# Altium footprint library Footprints.PcbLib: 266 footprints (part 16 of 17)
Each footprint in its own frame and in the unit in brackets; x right, y up, seen from the top. Pads: shape width x height; smd on the part's side, far side on the other; paste and mask are expansions set on the pad; w line width, h text height; cw(c..) or ccw(c..) is an arc to the next point about the centre after c.
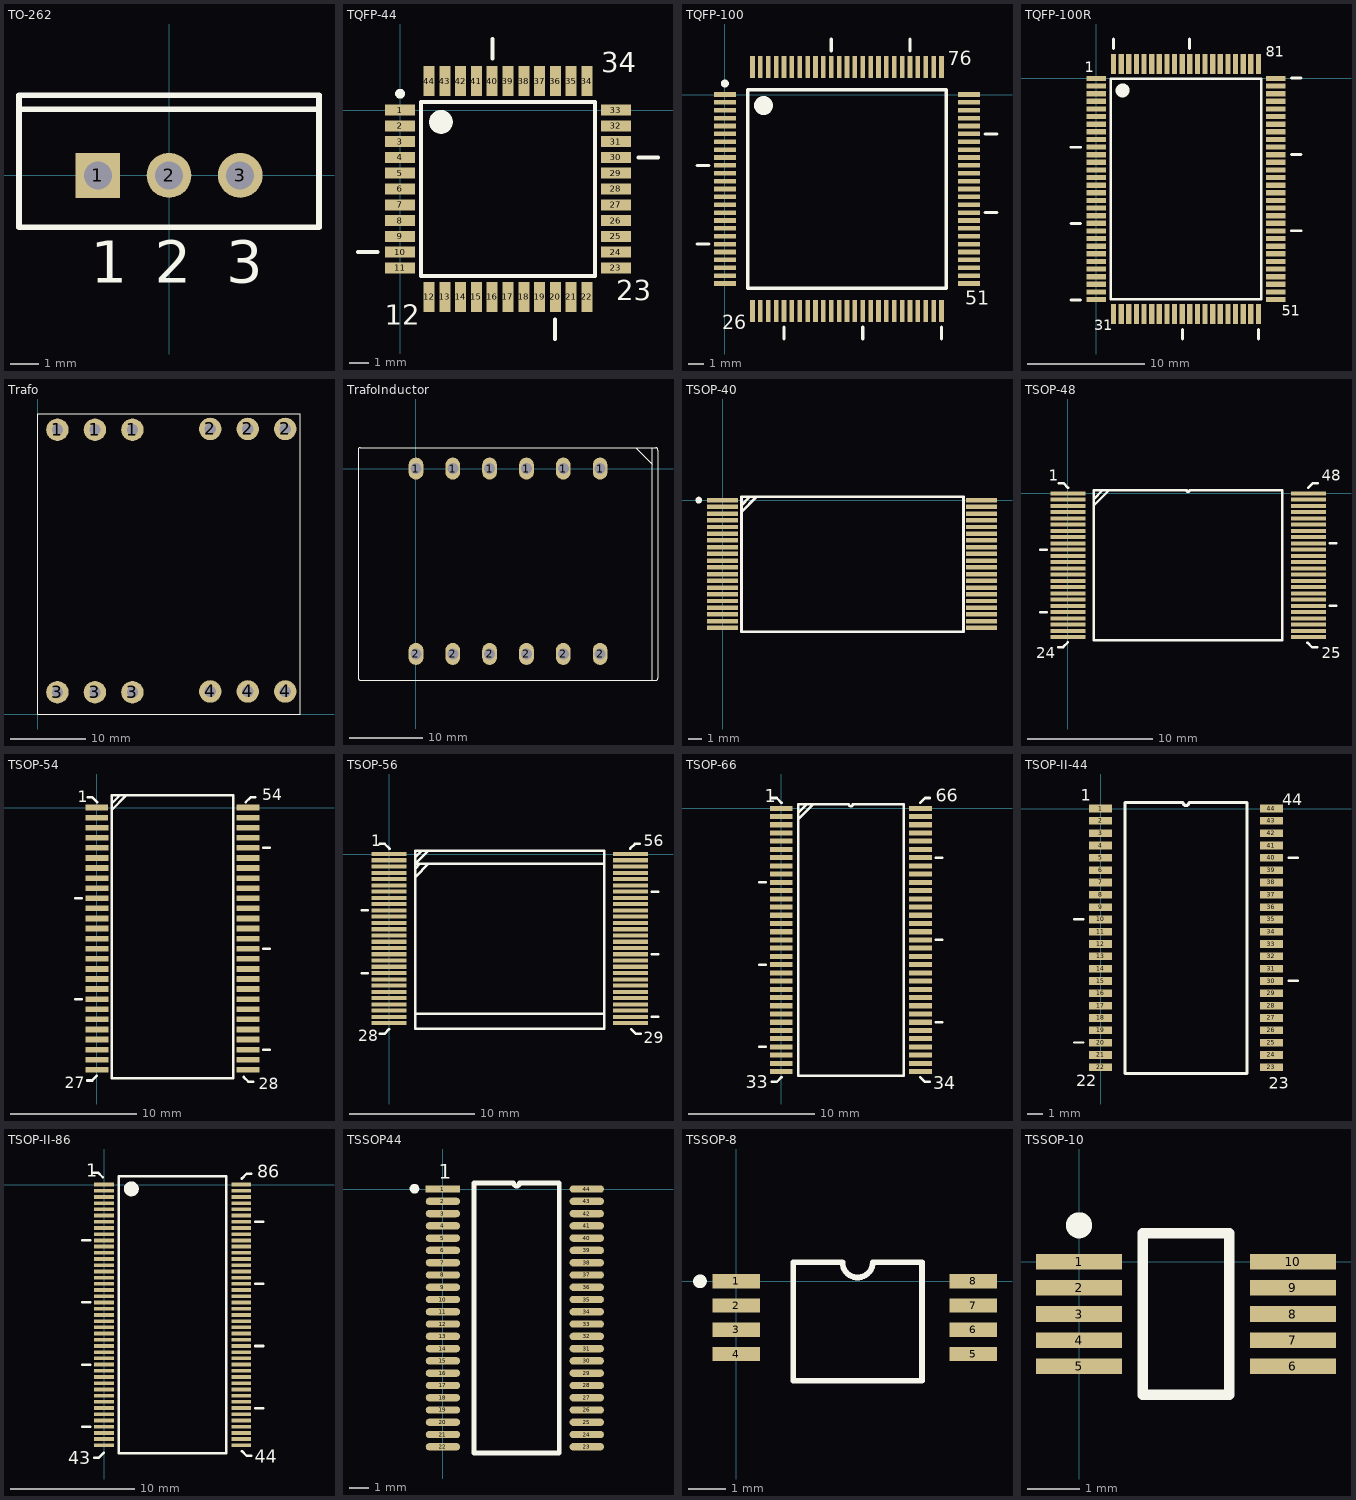
[diagram p15: the footprints below, top view; thin cyan lines are the x and y axes]

## TO-262 [mm] "TO, Thru-Hole, Vertical, Heatsink Mounted; 3 In-Line Leads; Pitch 2.54 mm"
height 14.6
pads (3):
  rect 1.6x1.6 hole 1: 1(-2.54,0)
  round 1.6 hole 1: 2(0,0) 3(2.54,0)
Top Overlay:
  lines w0.2: -5.35,2.35 5.35,2.35 ; -5.35,-1.85 -5.35,2.85 5.35,2.85 5.35,-1.85 -5.35,-1.85
  text "3" at 2.04,-3.825 h1.5
  text "1" at -2.79,-3.825 h1.5
  text "2" at -0.5,-3.825 h1.5

## TQFP-44 [mm] "TQFP, 44-Leads, Body 12,2x12,2mm (max), Pitch 0,80mm, IPC Medium Density"
height 1.2
pads (44):
  rect 1.52x0.56 smd: 1(0,0) 2(0,-0.8) 3(0,-1.6) 4(0,-2.4) 5(0,-3.2) 6(0,-4) 7(0,-4.8) 8(0,-5.6) 9(0,-6.4) 10(0,-7.2) 11(0,-8) 23(10.94,-8) 24(10.94,-7.2) 25(10.94,-6.4) 26(10.94,-5.6) 27(10.94,-4.8) 28(10.94,-4) 29(10.94,-3.2) 30(10.94,-2.4) 31(10.94,-1.6) 32(10.94,-0.8) 33(10.94,0)
  rect 0.56x1.52 smd: 12(1.47,-9.47) 13(2.27,-9.47) 14(3.07,-9.47) 15(3.87,-9.47) 16(4.67,-9.47) 17(5.47,-9.47) 18(6.27,-9.47) 19(7.07,-9.47) 20(7.87,-9.47) 21(8.67,-9.47) 22(9.47,-9.47) 34(9.47,1.47) 35(8.67,1.47) 36(7.87,1.47) 37(7.07,1.47) 38(6.27,1.47) 39(5.47,1.47) 40(4.67,1.47) 41(3.87,1.47) 42(3.07,1.47) 43(2.27,1.47) 44(1.47,1.47)
Top Overlay:
  circle w0.6: c2.07,-0.6 r0.3
  circle w0.25: c0,0.83 r0.125
  lines w0.2: 1.07,-8.4 9.87,-8.4 9.87,0.4 1.07,0.4 1.07,-8.4
  lines w0.203: -2.134,-7.188 -1.143,-7.188 ; 4.682,2.613 4.682,3.604 ; 7.858,-11.604 7.858,-10.613 ; 12.083,-2.412 13.074,-2.412
  text "34" at 10.185,1.93 h1.02
  text "23" at 10.947,-9.652 h1.02
  text "12" at -0.787,-10.871 h1.02
3D body "User Library-TQFP-44-1.STEP": height 1.1, standoff 0, extent -0.533,-9.988 11.467,2.012

## TQFP-100 [mm] "TQFP, 100-Leads, Body 16mm x 16mm x 1.6mm, Pitch 0,50mm"
height 1.6
pads (100):
  rect 1.4x0.3 smd: 1(0,0) 2(0,-0.5) 3(0,-1) 4(0,-1.5) 5(0,-2) 6(0,-2.5) 7(0,-3) 8(0,-3.5) 9(0,-4) 10(0,-4.5) 11(0,-5) 12(0,-5.5) 13(0,-6) 14(0,-6.5) 15(0,-7) 16(0,-7.5) 17(0,-8) 18(0,-8.5) 19(0,-9) 20(0,-9.5) 21(0,-10) 22(0,-10.5) 23(0,-11) 24(0,-11.5) 25(0,-12) 51(15.5,-12) 52(15.5,-11.5) 53(15.5,-11) 54(15.5,-10.5) 55(15.5,-10) 56(15.5,-9.5) 57(15.5,-9) 58(15.5,-8.5) 59(15.5,-8) 60(15.5,-7.5) 61(15.5,-7) 62(15.5,-6.5) 63(15.5,-6) 64(15.5,-5.5) 65(15.5,-5) 66(15.5,-4.5) 67(15.5,-4) 68(15.5,-3.5) 69(15.5,-3) 70(15.5,-2.5) 71(15.5,-2) 72(15.5,-1.5) 73(15.5,-1) 74(15.5,-0.5) 75(15.5,0)
  rect 0.3x1.4 smd: 26(1.75,-13.75) 27(2.25,-13.75) 28(2.75,-13.75) 29(3.25,-13.75) 30(3.75,-13.75) 31(4.25,-13.75) 32(4.75,-13.75) 33(5.25,-13.75) 34(5.75,-13.75) 35(6.25,-13.75) 36(6.75,-13.75) 37(7.25,-13.75) 38(7.75,-13.75) 39(8.25,-13.75) 40(8.75,-13.75) 41(9.25,-13.75) 42(9.75,-13.75) 43(10.25,-13.75) 44(10.75,-13.75) 45(11.25,-13.75) 46(11.75,-13.75) 47(12.25,-13.75) 48(12.75,-13.75) 49(13.25,-13.75) 50(13.75,-13.75) 76(13.75,1.75) 77(13.25,1.75) 78(12.75,1.75) 79(12.25,1.75) 80(11.75,1.75) 81(11.25,1.75) 82(10.75,1.75) 83(10.25,1.75) 84(9.75,1.75) 85(9.25,1.75) 86(8.75,1.75) 87(8.25,1.75) 88(7.75,1.75) 89(7.25,1.75) 90(6.75,1.75) 91(6.25,1.75) 92(5.75,1.75) 93(5.25,1.75) 94(4.75,1.75) 95(4.25,1.75) 96(3.75,1.75) 97(3.25,1.75) 98(2.75,1.75) 99(2.25,1.75) 100(1.75,1.75)
Top Overlay:
  circle w0.25: c0,0.7 r0.125
  circle w0.6: c2.45,-0.7 r0.3
  lines w0.2: 1.45,-12.3 1.45,0.3 14.05,0.3 14.05,-12.3 1.45,-12.3
  lines w0.203: -1.775,-9.501 -1.013,-9.501 ; -1.775,-4.501 -1.013,-4.501 ; 3.751,-15.525 3.751,-14.763 ; 6.749,2.763 6.749,3.525 ; 8.751,-15.525 8.751,-14.763 ; 11.749,2.763 11.749,3.525 ; 13.751,-15.525 13.751,-14.763 ; 16.513,-7.499 17.275,-7.499 ; 16.513,-2.499 17.275,-2.499
  text "26" at -0.175,-14.915 h0.89
  text "51" at 15.268,-13.341 h0.89
  text "76" at 14.151,1.849 h0.89
3D body "SW3dPS-TQFP100-1.STEP": height 1.61, standoff -0.01, extent -0.251,-13.999 15.749,2.001

## TQFP-100R [mm] "TQFP, 100-Leads, Body 22mm x 16mm x 1.6mm, Pitch 0,65mm"
height 1.6
pads (100):
  rect 1.7x0.45 smd: 1(0,0) 2(0,-0.65) 3(0,-1.3) 4(0,-1.95) 5(0,-2.6) 6(0,-3.25) 7(0,-3.9) 8(0,-4.55) 9(0,-5.2) 10(0,-5.85) 11(0,-6.5) 12(0,-7.15) 13(0,-7.8) 14(0,-8.45) 15(0,-9.1) 16(0,-9.75) 17(0,-10.4) 18(0,-11.05) 19(0,-11.7) 20(0,-12.35) 21(0,-13) 22(0,-13.65) 23(0,-14.3) 24(0,-14.95) 25(0,-15.6) 26(0,-16.25) 27(0,-16.9) 28(0,-17.55) 29(0,-18.2) 30(0,-18.85) 51(15.3,-18.85) 52(15.3,-18.2) 53(15.3,-17.55) 54(15.3,-16.9) 55(15.3,-16.25) 56(15.3,-15.6) 57(15.3,-14.95) 58(15.3,-14.3) 59(15.3,-13.65) 60(15.3,-13) 61(15.3,-12.35) 62(15.3,-11.7) 63(15.3,-11.05) 64(15.3,-10.4) 65(15.3,-9.75) 66(15.3,-9.1) 67(15.3,-8.45) 68(15.3,-7.8) 69(15.3,-7.15) 70(15.3,-6.5) 71(15.3,-5.85) 72(15.3,-5.2) 73(15.3,-4.55) 74(15.3,-3.9) 75(15.3,-3.25) 76(15.3,-2.6) 77(15.3,-1.95) 78(15.3,-1.3) 79(15.3,-0.65) 80(15.3,0)
  rect 0.45x1.7 smd: 31(1.475,-20.075) 32(2.125,-20.075) 33(2.775,-20.075) 34(3.425,-20.075) 35(4.075,-20.075) 36(4.725,-20.075) 37(5.375,-20.075) 38(6.025,-20.075) 39(6.675,-20.075) 40(7.325,-20.075) 41(7.975,-20.075) 42(8.625,-20.075) 43(9.275,-20.075) 44(9.925,-20.075) 45(10.575,-20.075) 46(11.225,-20.075) 47(11.875,-20.075) 48(12.525,-20.075) 49(13.175,-20.075) 50(13.825,-20.075) 81(13.825,1.225) 82(13.175,1.225) 83(12.525,1.225) 84(11.875,1.225) 85(11.225,1.225) 86(10.575,1.225) 87(9.925,1.225) 88(9.275,1.225) 89(8.625,1.225) 90(7.975,1.225) 91(7.325,1.225) 92(6.675,1.225) 93(6.025,1.225) 94(5.375,1.225) 95(4.725,1.225) 96(4.075,1.225) 97(3.425,1.225) 98(2.775,1.225) 99(2.125,1.225) 100(1.475,1.225)
Top Overlay:
  circle w0.6: c2.25,-1.025 r0.3
  lines w0.2: 1.25,-18.825 1.25,-0.025 14.05,-0.025 14.05,-18.825 1.25,-18.825
  lines w0.254: -2.134,-18.867 -1.321,-18.867 ; -2.134,-12.367 -1.321,-12.367 ; -2.134,-5.867 -1.321,-5.867 ; 1.458,2.546 1.458,3.359 ; 7.342,-22.209 7.342,-21.396 ; 7.958,2.546 7.958,3.359 ; 13.842,-22.209 13.842,-21.396 ; 16.621,-12.983 17.434,-12.983 ; 16.621,-6.483 17.434,-6.483 ; 16.621,0.017 17.434,0.017
  text "1" at -0.991,0.508 h0.89
  text "81" at 14.453,1.829 h0.89
  text "51" at 15.799,-20.244 h0.89
  text "31" at -0.178,-21.463 h0.89
3D body "tqfp-100-1.6mm.stp": height 1.55, standoff -0.1, extent -0.254,-20.327 15.546,1.473

## Trafo [mm]
pads (12):
  round 3 hole 1.5: 1(2.626,37.898) 1(7.626,37.898) 1(12.626,37.898) 2(23,38) 2(28,38) 2(33,38) 3(2.626,2.898) 3(7.626,2.898) 3(12.626,2.898) 4(23,3) 4(28,3) 4(33,3)
Top Overlay:
  lines w0.152: 0,0 35,0 35,40 0,40 0,0
3D body: height 35, standoff 30, extent -0.089,6.985 34.989,34.785
3D body: height 30, standoff 10, extent -0.17,7.163 4.296,34.786
3D body: height 30, standoff 10, extent 4.298,7.803 30.196,33.752
3D body: height 10, standoff 1, extent -0.146,0 35,39.768
3D body: height 30, standoff 10, extent 30.452,7.084 34.918,34.708

## TrafoInductor [mm]
pads (12):
  oval 2x3 hole 1.5: 1(0,0) 1(5,0) 1(10,0) 1(15,0) 1(20,0) 1(25,0) 2(0,-25.146) 2(5,-25.146) 2(10,-25.146) 2(15,-25.146) 2(20,-25.146) 2(25,-25.146)
Top Overlay:
  lines w0.152: -7.865,2.515 cw(c-7.544,2.515) -7.544,2.836 ; -7.855,2.515 -7.849,-28.397 ; -7.844,-28.397 ccw(c-7.522,-28.397) -7.522,-28.719 ; -7.544,2.841 32.53,2.841 ; -7.522,-28.731 32.534,-28.731 ; 29.82,2.819 32.055,0.584 32.055,0.559 ; 32.055,-28.702 32.055,2.841 ; 32.53,2.836 cw(c32.53,2.515) 32.851,2.515 ; 32.534,-28.726 ccw(c32.534,-28.405) 32.856,-28.405 32.856,2.515
3D body: height 10, standoff 1, extent -7.772,-28.804 32.131,2.87
3D body: height 30, standoff 10, extent -3.198,-28.077 26.684,1.864
3D body: height 30, standoff 10, extent -7.607,-28.969 -3.137,2.603
3D body: height 30, standoff 10, extent 27.546,-28.943 32.017,2.629
3D body: height 35, standoff 30, extent -7.556,-29.07 32.347,2.604

## TSOP-40 [mil]
pads (40):
  rect 90x13 smd: 1(0,0) 2(0,-19.68) 3(0,-39.37) 4(0,-59.05) 5(0,-78.74) 6(0,-98.42) 7(0,-118.11) 8(0,-137.79) 9(0,-157.48) 10(0,-177.16) 11(0,-196.85) 12(0,-216.53) 13(0,-236.22) 14(0,-255.91) 15(0,-275.59) 16(0,-295.27) 17(0,-314.96) 18(0,-334.64) 19(0,-354.33) 20(0,-374.01) 21(757.87,-374.01) 22(757.87,-354.33) 23(757.87,-334.64) 24(757.87,-314.96) 25(757.87,-295.27) 26(757.87,-275.59) 27(757.87,-255.91) 28(757.87,-236.22) 29(757.87,-216.53) 30(757.87,-196.85) 31(757.87,-177.16) 32(757.87,-157.48) 33(757.87,-137.79) 34(757.87,-118.11) 35(757.87,-98.42) 36(757.87,-78.74) 37(757.87,-59.05) 38(757.87,-39.37) 39(757.87,-19.68) 40(757.87,0)
Top Overlay:
  circle w9.84: c-70,0 r4.92
  lines w8: 55,-35 100,10 ; 55,-15 80,10 ; 55,-385 705,-385 705,10 55,10 55,-385

## TSOP-48 [mm]
pads (48):
  rect 2.8x0.33 smd: 1(0,0) 2(0,-0.5) 3(0,-1) 4(0,-1.5) 5(0,-2) 6(0,-2.5) 7(0,-3) 8(0,-3.5) 9(0,-4) 10(0,-4.5) 11(0,-5) 12(0,-5.5) 13(0,-6) 14(0,-6.5) 15(0,-7) 16(0,-7.5) 17(0,-8) 18(0,-8.5) 19(0,-9) 20(0,-9.5) 21(0,-10) 22(0,-10.5) 23(0,-11) 24(0,-11.5) 25(19.25,-11.5) 26(19.25,-11) 27(19.25,-10.5) 28(19.25,-10) 29(19.25,-9.5) 30(19.25,-9) 31(19.25,-8.5) 32(19.25,-8) 33(19.25,-7.5) 34(19.25,-7) 35(19.25,-6.5) 36(19.25,-6) 37(19.25,-5.5) 38(19.25,-5) 39(19.25,-4.5) 40(19.25,-4) 41(19.25,-3.5) 42(19.25,-3) 43(19.25,-2.5) 44(19.25,-2) 45(19.25,-1.5) 46(19.25,-1) 47(19.25,-0.5) 48(19.25,0)
Top Overlay:
  lines w0.2: 2.085,-0.955 3.29,0.25 ; 2.085,-0.447 2.782,0.25
  lines w0.203: -2.204,-9.5 -1.696,-9.5 ; -2.204,-4.5 -1.696,-4.5 ; -0.762,-12.295 -0.381,-12.295 0,-11.914 ; -0.737,0.813 -0.356,0.813 0.025,0.432 ; 19.174,-11.939 19.555,-12.32 19.936,-12.32 ; 19.225,0.432 19.606,0.813 19.987,0.813 ; 20.946,-9 21.454,-9 ; 20.946,-4 21.454,-4 ; 2.085,-11.75 17.165,-11.75 17.165,0.25 9.75,0.25 cw(c9.625,0.25) 9.5,0.25 2.085,0.25 2.085,-11.75
  text "24" at -2.54,-13.208 h0.89
  text "1" at -1.524,1.016 h0.89
  text "25" at 20.32,-13.208 h0.89
  text "48" at 20.32,1.016 h0.89
3D body "TSOP-48.STEP": height 1.2, standoff -0.06, extent -0.425,-11.8 19.675,0.3

## TSOP-54 [mm]
pads (54):
  rect 1.8x0.45 smd: 1(0.01,0) 2(0.01,-0.8) 3(0.02,-1.6) 4(0.02,-2.4) 5(0.02,-3.2) 6(0.02,-4) 7(0.02,-4.8) 8(0.02,-5.6) 9(0.02,-6.4) 10(0.02,-7.2) 11(0.02,-8) 12(0.02,-8.8) 13(0.02,-9.6) 14(0.02,-10.4) 15(0.02,-11.2) 16(0.02,-12) 17(0.02,-12.8) 18(0.02,-13.6) 19(0.02,-14.4) 20(0.02,-15.2) 21(0.02,-16) 22(0.02,-16.8) 23(0.02,-17.6) 24(0.02,-18.4) 25(0.02,-19.2) 26(0.02,-20) 27(0.02,-20.8) 28(12.01,-20.8) 29(12.01,-20) 30(12.01,-19.2) 31(12.01,-18.4) 32(12.01,-17.6) 33(12.01,-16.8) 34(12.01,-16) 35(12.01,-15.2) 36(12.01,-14.4) 37(12.01,-13.6) 38(12.01,-12.8) 39(12.01,-12) 40(12.01,-11.2) 41(12.01,-10.4) 42(12.01,-9.6) 43(12.01,-8.8) 44(12.01,-8) 45(12.01,-7.2) 46(12.01,-6.4) 47(12.01,-5.6) 48(12.01,-4.8) 49(12.01,-4) 50(12.01,-3.2) 51(12.01,-2.4) 52(12.01,-1.6) 53(12.01,-0.8) 54(12.01,0)
Top Overlay:
  lines w0.203: -1.702,-15.2 -1.194,-15.2 ; -1.702,-7.2 -1.194,-7.2 ; -0.747,-21.65 -0.366,-21.65 0.015,-21.269 ; -0.727,0.813 -0.346,0.813 0.035,0.432 ; 1.194,-0.178 2.337,0.965 ; 1.194,0.33 1.829,0.965 ; 11.655,-21.369 12.036,-21.75 12.417,-21.75 ; 11.825,0.432 12.206,0.813 12.587,0.813 ; 13.224,-19.2 13.732,-19.2 ; 13.224,-11.2 13.732,-11.2 ; 13.224,-3.2 13.732,-3.2 ; 1.194,-21.488 10.846,-21.488 10.846,0.965 1.194,0.965 1.194,-21.488
  text "27" at -2.54,-22.276 h0.89
  text "1" at -1.489,0.432 h0.89
  text "28" at 12.852,-22.327 h0.89
  text "54" at 13.123,0.584 h0.89

## TSOP-56 [mm]
pads (56):
  rect 2.8x0.33 smd: 1(0,0) 2(0,-0.5) 3(0,-1) 4(0,-1.5) 5(0,-2) 6(0,-2.5) 7(0,-3) 8(0,-3.5) 9(0,-4) 10(0,-4.5) 11(0,-5) 12(0,-5.5) 13(0,-6) 14(0,-6.5) 15(0,-7) 16(0,-7.5) 17(0,-8) 18(0,-8.5) 19(0,-9) 20(0,-9.5) 21(0,-10) 22(0,-10.5) 23(0,-11) 24(0,-11.5) 25(0,-12) 26(0,-12.5) 27(0,-13) 28(0,-13.5) 29(19.25,-13.5) 30(19.25,-13) 31(19.25,-12.5) 32(19.25,-12) 33(19.25,-11.5) 34(19.25,-11) 35(19.25,-10.5) 36(19.25,-10) 37(19.25,-9.5) 38(19.25,-9) 39(19.25,-8.5) 40(19.25,-8) 41(19.25,-7.5) 42(19.25,-7) 43(19.25,-6.5) 44(19.25,-6) 45(19.25,-5.5) 46(19.25,-5) 47(19.25,-4.5) 48(19.25,-4) 49(19.25,-3.5) 50(19.25,-3) 51(19.25,-2.5) 52(19.25,-2) 53(19.25,-1.5) 54(19.25,-1) 55(19.25,-0.5) 56(19.25,0)
Top Overlay:
  lines w0.203: -2.204,-9.5 -1.696,-9.5 ; -2.204,-4.5 -1.696,-4.5 ; -0.762,-14.351 -0.381,-14.351 0,-13.97 ; -0.737,0.813 -0.356,0.813 0.025,0.432 ; 2.085,-1.829 3.142,-0.772 ; 2.085,-1.168 2.481,-0.772 ; 2.085,-0.254 2.593,0.254 ; 2.093,-12.741 17.104,-12.741 ; 3.101,0.254 2.085,-0.762 17.146,-0.762 ; 17.145,0.254 2.085,0.25 2.085,-11.75 2.083,-13.945 17.17,-13.945 17.165,-11.75 17.165,0.25 ; 19.225,0.432 19.606,0.813 19.987,0.813 ; 19.304,-13.97 19.685,-14.351 20.066,-14.351 ; 20.946,-13 21.454,-13 ; 20.946,-8 21.454,-8 ; 20.946,-3 21.454,-3
  text "56" at 20.32,0.635 h0.89
  text "29" at 20.32,-15.088 h0.89
  text "1" at -1.422,0.635 h0.89
  text "28" at -2.489,-14.961 h0.89
3D body "TSOP-48.STEP": height 1.2, standoff -0.06, extent -0.65,-12.8 19.45,-0.7

## TSOP-66 [mm]
pads (66):
  rect 1.8x0.4 smd: 1(0,0) 2(0,-0.65) 3(0,-1.3) 4(0,-1.95) 5(0,-2.6) 6(0,-3.25) 7(0,-3.9) 8(0,-4.55) 9(0,-5.2) 10(0,-5.85) 11(0,-6.5) 12(0,-7.15) 13(0,-7.8) 14(0,-8.45) 15(0,-9.1) 16(0,-9.75) 17(0,-10.4) 18(0,-11.05) 19(0,-11.7) 20(0,-12.35) 21(0,-13) 22(0,-13.65) 23(0,-14.3) 24(0,-14.95) 25(0,-15.6) 26(0,-16.25) 27(0,-16.9) 28(0,-17.55) 29(0,-18.2) 30(0,-18.85) 31(0,-19.5) 32(0,-20.15) 33(0,-20.8) 34(11,-20.8) 35(11,-20.15) 36(11,-19.5) 37(11,-18.85) 38(11,-18.2) 39(11,-17.55) 40(11,-16.9) 41(11,-16.25) 42(11,-15.6) 43(11,-14.95) 44(11,-14.3) 45(11,-13.65) 46(11,-13) 47(11,-12.35) 48(11,-11.7) 49(11,-11.05) 50(11,-10.4) 51(11,-9.75) 52(11,-9.1) 53(11,-8.45) 54(11,-7.8) 55(11,-7.15) 56(11,-6.5) 57(11,-5.85) 58(11,-5.2) 59(11,-4.55) 60(11,-3.9) 61(11,-3.25) 62(11,-2.6) 63(11,-1.95) 64(11,-1.3) 65(11,-0.65) 66(11,0)
Top Overlay:
  lines w0.2: 1.335,-0.88 2.54,0.325 ; 1.335,-0.372 2.032,0.325 ; 1.335,-21.125 9.665,-21.125 9.665,0.325 5.662,0.325 cw(c5.5,0.325) 5.337,0.325 1.335,0.325 1.335,-21.125
  lines w0.203: -1.722,-18.85 -1.214,-18.85 ; -1.722,-12.35 -1.214,-12.35 ; -1.722,-5.85 -1.214,-5.85 ; -0.737,-21.613 -0.356,-21.613 0.025,-21.232 ; -0.737,0.813 -0.356,0.813 0.025,0.432 ; 10.975,-21.232 11.356,-21.613 11.737,-21.613 ; 10.975,0.432 11.356,0.813 11.737,0.813 ; 12.214,-16.9 12.722,-16.9 ; 12.214,-10.4 12.722,-10.4 ; 12.214,-3.9 12.722,-3.9
  text "66" at 12.192,0.508 h1.02
  text "34" at 12.014,-22.174 h1.02
  text "1" at -1.295,0.483 h1.02
  text "33" at -2.819,-22.123 h1.02
3D body "TSOP-66.STEP": height 1.2, standoff 0, extent -0.355,-21.545 11.405,0.675

## TSOP-II-44 [mm]
pads (44):
  rect 1.5x0.5 smd: 1(0,0) 2(0,-0.8) 3(0,-1.6) 4(0,-2.4) 5(0,-3.2) 6(0,-4) 7(0,-4.8) 8(0,-5.6) 9(0,-6.4) 10(0,-7.2) 11(0,-8) 12(0,-8.8) 13(0,-9.6) 14(0,-10.4) 15(0,-11.2) 16(0,-12) 17(0,-12.8) 18(0,-13.6) 19(0,-14.4) 20(0,-15.2) 21(0,-16) 22(0,-16.8) 23(11.1,-16.8) 24(11.1,-16) 25(11.1,-15.2) 26(11.1,-14.4) 27(11.1,-13.6) 28(11.1,-12.8) 29(11.1,-12) 30(11.1,-11.2) 31(11.1,-10.4) 32(11.1,-9.6) 33(11.1,-8.8) 34(11.1,-8) 35(11.1,-7.2) 36(11.1,-6.4) 37(11.1,-5.6) 38(11.1,-4.8) 39(11.1,-4) 40(11.1,-3.2) 41(11.1,-2.4) 42(11.1,-1.6) 43(11.1,-0.8) 44(11.1,0)
Top Overlay:
  lines w0.152: -1.727,-15.188 -1.118,-15.188 ; -1.727,-7.188 -1.118,-7.188 ; 12.218,-11.188 12.827,-11.188 ; 12.218,-3.188 12.827,-3.188
  lines w0.2: 1.585,-17.2 9.515,-17.2 9.515,0.4 5.75,0.4 cw(c5.55,0.4) 5.35,0.4 1.585,0.4 1.585,-17.2
  text "1" at -1.27,0.508 h0.76
  text "22" at -1.575,-18.034 h0.76
  text "44" at 11.786,0.229 h0.76
  text "23" at 10.922,-18.212 h0.76
3D body "User Library-44L-TSOP2.step": height 1.08, standoff -0.02, extent -0.285,-17.61 11.475,0.81

## TSOP-II-86 [mm] "TSSOP, 86-Leads, Body 22,3x10,2mm (max), Pitch 0,50mm, IPC Medium Density"
height 1.2
pads (86):
  rect 1.6x0.3 smd: 1(0,0) 2(0,-0.5) 3(0,-1) 4(0,-1.5) 5(0,-2) 6(0,-2.5) 7(0,-3) 8(0,-3.5) 9(0,-4) 10(0,-4.5) 11(0,-5) 12(0,-5.5) 13(0,-6) 14(0,-6.5) 15(0,-7) 16(0,-7.5) 17(0,-8) 18(0,-8.5) 19(0,-9) 20(0,-9.5) 21(0,-10) 22(0,-10.5) 23(0,-11) 24(0,-11.5) 25(0,-12) 26(0,-12.5) 27(0,-13) 28(0,-13.5) 29(0,-14) 30(0,-14.5) 31(0,-15) 32(0,-15.5) 33(0,-16) 34(0,-16.5) 35(0,-17) 36(0,-17.5) 37(0,-18) 38(0,-18.5) 39(0,-19) 40(0,-19.5) 41(0,-20) 42(0,-20.5) 43(0,-21) 44(11.05,-21) 45(11.05,-20.5) 46(11.05,-20) 47(11.05,-19.5) 48(11.05,-19) 49(11.05,-18.5) 50(11.05,-18) 51(11.05,-17.5) 52(11.05,-17) 53(11.05,-16.5) 54(11.05,-16) 55(11.05,-15.5) 56(11.05,-15) 57(11.05,-14.5) 58(11.05,-14) 59(11.05,-13.5) 60(11.05,-13) 61(11.05,-12.5) 62(11.05,-12) 63(11.05,-11.5) 64(11.05,-11) 65(11.05,-10.5) 66(11.05,-10) 67(11.05,-9.5) 68(11.05,-9) 69(11.05,-8.5) 70(11.05,-8) 71(11.05,-7.5) 72(11.05,-7) 73(11.05,-6.5) 74(11.05,-6) 75(11.05,-5.5) 76(11.05,-5) 77(11.05,-4.5) 78(11.05,-4) 79(11.05,-3.5) 80(11.05,-3) 81(11.05,-2.5) 82(11.05,-2) 83(11.05,-1.5) 84(11.05,-1) 85(11.05,-0.5) 86(11.05,0)
Top Overlay:
  circle w0.6: c2.2,-0.35 r0.3
  lines w0.2: 1.2,-21.65 9.85,-21.65 9.85,0.65 1.2,0.65 1.2,-21.65
  lines w0.203: -1.753,-19.496 -1.118,-19.496 ; -1.753,-14.496 -1.118,-14.496 ; -1.753,-9.496 -1.118,-9.496 ; -1.753,-4.496 -1.118,-4.496 ; -0.864,0.965 -0.483,0.965 -0.102,0.584 ; -0.787,-21.994 -0.406,-21.994 -0.025,-21.613 ; 11.102,-21.46 11.483,-21.841 11.864,-21.841 ; 11.102,0.483 11.483,0.864 11.864,0.864 ; 12.168,-18.004 12.803,-18.004 ; 12.168,-13.004 12.803,-13.004 ; 12.168,-8.004 12.803,-8.004 ; 12.168,-3.004 12.803,-3.004
  text "86" at 12.319,0.559 h1.02
  text "44" at 12.141,-22.403 h1.02
  text "1" at -1.422,0.635 h1.02
  text "43" at -2.87,-22.504 h1.02
3D body "User Library-TSOP-86.STEP": height 1.06, standoff -0.03, extent -0.359,-21.487 11.43,0.507

## TSSOP44 [mil]
pads (44):
  rect 70x15 smd: 1(0,0)
  oval 70x15 smd: 2(0,-25) 3(0,-50) 4(0,-75) 5(0,-100) 6(0,-125) 7(0,-150) 8(0,-175) 9(0,-200) 10(0,-225) 11(0,-250) 12(0,-275) 13(0,-300) 14(0,-325) 15(0,-350) 16(0,-375) 17(0,-400) 18(0,-425) 19(0,-450) 20(0,-475) 21(0,-500) 22(0,-525) 23(293,-525) 24(293,-500) 25(293,-475) 26(293,-450) 27(293,-425) 28(293,-400) 29(293,-375) 30(293,-350) 31(293,-325) 32(293,-300) 33(293,-275) 34(293,-250) 35(293,-225) 36(293,-200) 37(293,-175) 38(293,-150) 39(293,-125) 40(293,-100) 41(293,-75) 42(293,-50) 43(293,-25) 44(293,0)
Top Overlay:
  circle w9.84: c-58,0.68 r4.92
  lines w10: 63,-537.5 237,-537.5 237,12.5 156.25,12.5 cw(c150,12.5) 143.75,12.5 63,12.5 63,-537.5
  text "1" at -8,21 h30
3D body "User Library-HTSSOP44-0_65.STEP": height 47.24, standoff 0, extent -17,-539.56 309.77,15.55

## TSSOP-8 [mil] "TSSOP, 8-Leads, Body 3,1x4,5mm (max), Pitch 0,65mm, IPC Low Density"
height 43.31
pads (8):
  rect 50x15 smd: 1(0,0) 2(0,-25.6) 3(0,-51.2) 4(0,-76.8) 5(250,-76.8) 6(250,-51.2) 7(250,-25.6) 8(250,0)
Top Overlay:
  circle w8: c-38.16,0 r3.16
  lines w6: 60,19 60,-105 196,-105 196,19 ; 60,20 112,20 ccw(c128,20) 144,20 196,20
3D body "TSS0P8-1.STEP": height 43, standoff 0, extent 2.38,-101.11 249.62,17

## TSSOP-10 [mm]
height 1.1
pads (10):
  rect 1.65x0.3 smd: 1(0,0) 2(0,-0.5) 3(0,-1) 4(0,-1.5) 5(0,-2) 6(4.1,-2) 7(4.1,-1.5) 8(4.1,-1) 9(4.1,-0.5) 10(4.1,0)
Top Overlay:
  circle w0.25: c0,0.7 r0.125
  lines w0.2: 1.225,-2.55 2.875,-2.55 2.875,0.55 1.225,0.55 1.225,-2.55
3D body "SW3dPS-TSSOP-10.STEP": height 1.1, standoff 0, extent -0.45,-2.5 4.55,0.5